# Altium footprint library chipfc_libs.PCBLIB: 337 footprints (part 5 of 22)
Each footprint in its own frame and in the unit in brackets; x right, y up, seen from the top. Pads: shape width x height; smd on the part's side, far side on the other; paste and mask are expansions set on the pad; w line width, h text height; cw(c..) or ccw(c..) is an arc to the next point about the centre after c.
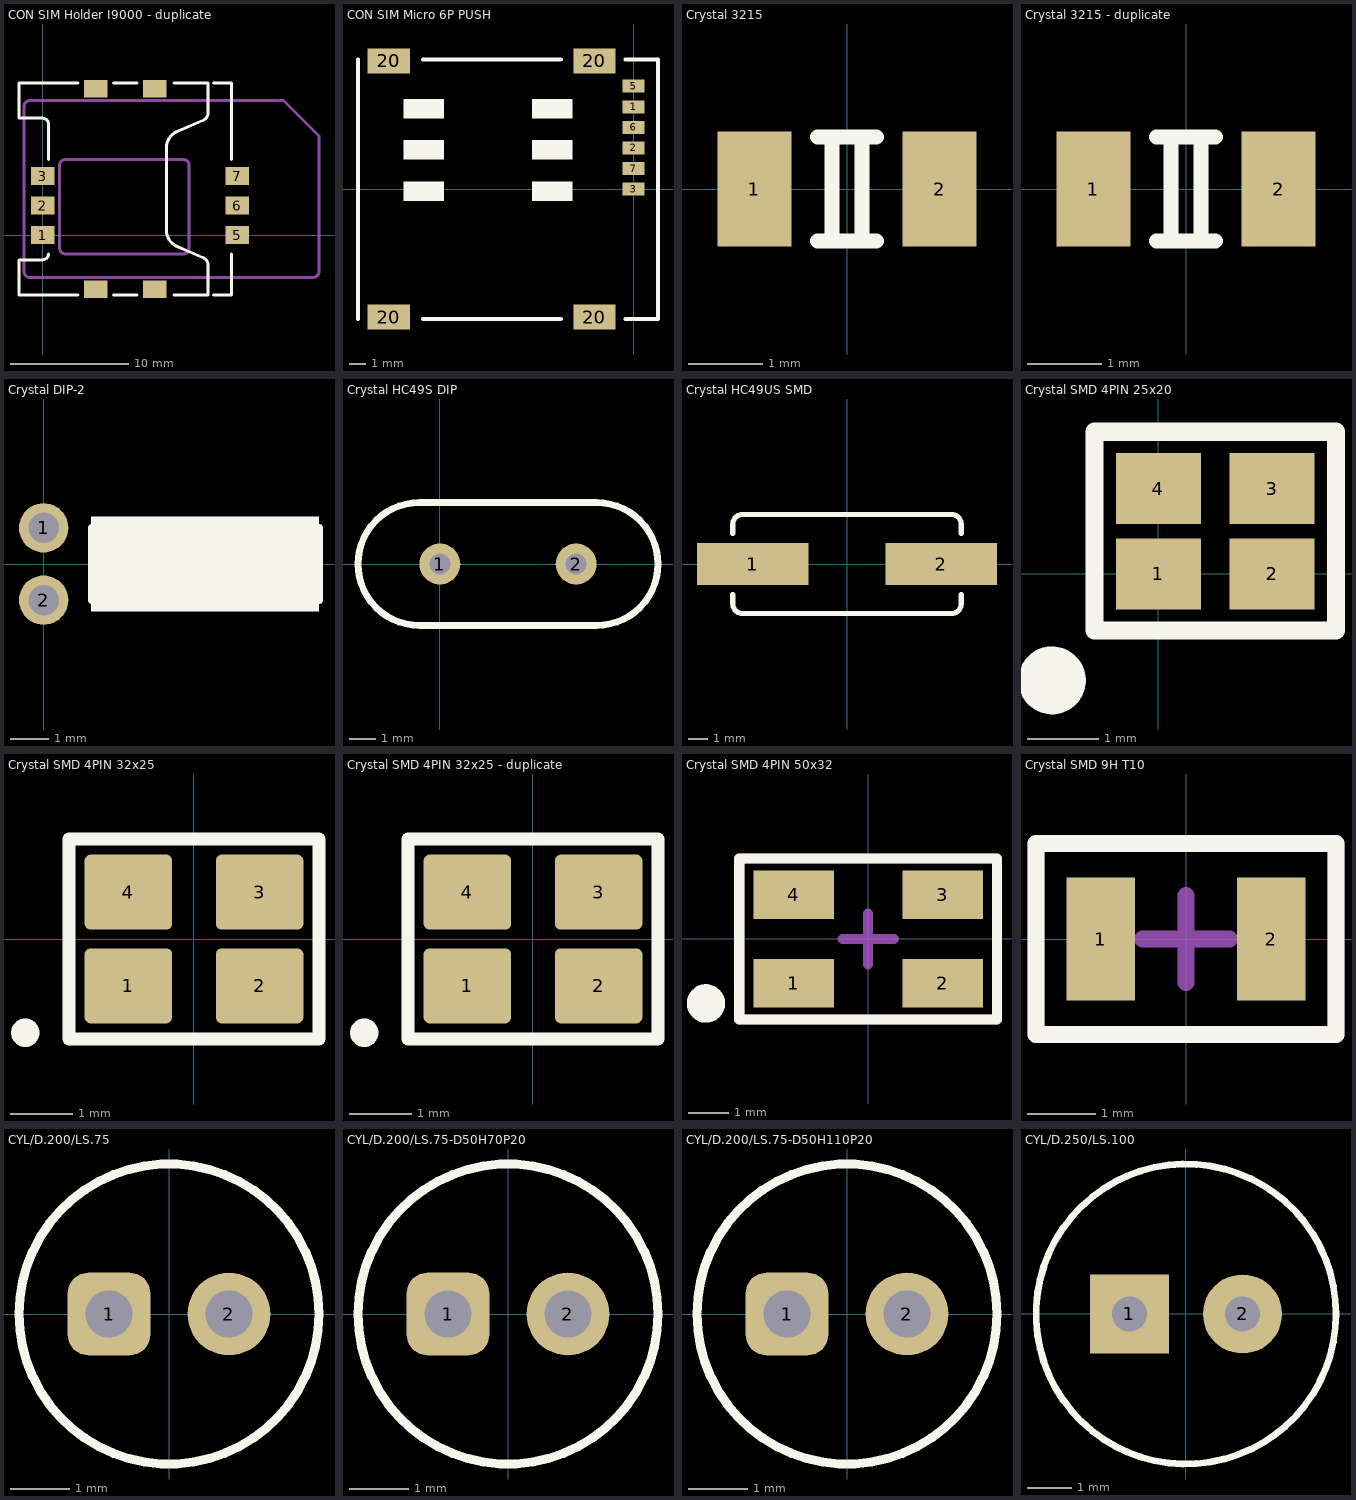
[diagram p4: the footprints below, top view; thin cyan lines are the x and y axes]

## CON SIM Holder I9000 - duplicate [mm] "Molex's SIM Holder,  6 pins"
pads (10):
  rect 2x1.5 smd: 1(0,0) 2(0,2.5) 3(0,5) 5(16.5,0) 6(16.5,2.5) 7(16.5,5) ""(4.5,-4.6) ""(4.5,12.4) ""(9.5,-4.6) ""(9.5,12.4)
Top Overlay:
  lines w0.254: 0.5,-1.6 cw(c0,-1.6) 0,-2.1 -2,-2.1 -2,-5.1 3,-5.1 ; 3,12.9 -2,12.9 -2,9.9 0,9.9 cw(c0,9.4) 0.5,9.4 0.5,6.4 ; 6,-5.1 8,-5.1 ; 6,12.9 8,12.9 ; 11.12,-5.1 14,-5.1 14,-2.5 ; 11.12,12.9 14,12.9 14,10.3 ; 14.008,-2.5 ccw(c13.4,-2.5) 13.6,-1.926 11.504,-1.016 cw(c12,0.4) 10.5,0.4 10.5,7.4 cw(c12,7.4) 11.504,8.816 13.6,9.726 ccw(c13.4,10.3) 14.008,10.3 ; 14.5,-5.1 16,-5.1 16,-1.6 ; 14.5,12.9 16,12.9 16,6.4 ; 0.5,6.4 0.5,6.4
Mechanical 1:
  lines w0.254: -1.57,-3.1 ccw(c-1.07,-3.1) -1.07,-3.6 22.93,-3.6 ccw(c22.93,-3.1) 23.43,-3.1 23.43,8.4 20.43,11.4 -1.07,11.4 ccw(c-1.07,10.9) -1.57,10.9 -1.57,-3.1 ; 1.43,-1.1 ccw(c1.93,-1.1) 1.93,-1.6 11.93,-1.6 ccw(c11.93,-1.1) 12.43,-1.1 12.43,5.9 ccw(c11.93,5.9) 11.93,6.4 1.93,6.4 ccw(c1.93,5.9) 1.43,5.9 1.43,-1.1

## CON SIM Micro 6P PUSH [mm] "SIM Holder,  6 pins"
pads (16):
  rect 1.35x0.8 smd: 1(0,5.08) 2(0,2.54) 3(0,0) 5(0,6.35) 6(0,3.81) 7(0,1.27)
  rect 2.6x1.55 smd: 20(-15.105,-7.89) 20(-15.105,7.91) 20(-2.425,-7.89) 20(-2.425,7.91)
  rect 2.5x1.2 on Top Overlay: ""(-12.955,-0.12) ""(-12.955,2.42) ""(-12.955,4.96) ""(-5.035,-0.12) ""(-5.035,2.42) ""(-5.035,4.96)
Top Overlay:
  lines w0.254: -17,-8 -17,8 ; -13,-8 -4.5,-8 ; -13,8 -4.5,8 ; -0.5,-8 1.5,-8 1.5,8 -0.5,8
3D body "2174803-2.stp": height 1.25, standoff -0.64, extent -16,-7.745 0,7.745

## Crystal 3215 [mm] "Crystal 3.2mm x 1.5mm SMD"
pads (2):
  rect 1x1.55 smd: 1(-1.25,0) 2(1.25,0)
Top Overlay:
  lines w0.203: -0.4,-0.7 0.4,-0.7 ; -0.4,0.7 0.4,0.7 ; -0.2,-0.7 -0.2,0.7 ; 0.2,-0.7 0.2,0.7
3D body "User Library-Siward_SX3215.step": height 0.81, standoff 0, extent -1.6,-0.75 1.6,0.75

## Crystal 3215 - duplicate [mm] "Crystal 3.2mm x 1.5mm SMD"
pads (2):
  rect 1x1.55 smd: 1(-1.25,0) 2(1.25,0)
Top Overlay:
  lines w0.203: -0.4,-0.7 0.4,-0.7 ; -0.4,0.7 0.4,0.7 ; -0.2,-0.7 -0.2,0.7 ; 0.2,-0.7 0.2,0.7
3D body "User Library-Siward_SX3215.step": height 0.81, standoff 0, extent -1.6,-0.75 1.6,0.75

## Crystal DIP-2 [mm] "Available for crystal 32.768kHz"
pads (2):
  round 1.3 hole 0.8: 1(0,0.953) 2(0,-0.953)
Top Overlay:
  rectangle: 1.25,-1.25 7.25,1.25
  lines w0.203: 1.27,-0.953 1.27,0.953 7.25,0.953 7.25,-0.953 1.27,-0.953
3D body "User Library-DT-26-1.step": height 2.1, standoff -1.9, extent -0.1,-1 7.04,1

## Crystal HC49S DIP [mil]
pads (2):
  round 60 / inner round 60 / far side round 70 hole 31: 1(0,0) 2(200,0)
Top Overlay:
  lines w10: -30,-90 cw(c-30,0) -30,90 230,90 cw(c230,0) 230,-90 -30,-90
3D body "User Library-HC49S.STEP": height 142.73, standoff -77.74, extent -119.93,-92.96 319.93,91

## Crystal HC49US SMD [mil]
pads (2):
  rect 220.47x82.67 smd: 1(-187,0) 2(187,0)
Top Overlay:
  lines w10: -226.37,-60 -226.37,-78.73 ccw(c-206.68,-78.73) -206.68,-98.42 206.68,-98.42 ccw(c206.68,-78.73) 226.37,-78.73 226.37,-60 ; -226.37,60 -226.37,78.73 cw(c-206.68,78.73) -206.68,98.42 206.68,98.42 cw(c206.68,78.73) 226.37,78.73 226.37,60
3D body "User Library-HC49US.STEP": height 165.35, standoff 0, extent -250,-93 250,92.04

## Crystal SMD 4PIN 25x20 [mm]
pads (4):
  rect 1.2x1 smd: 1(0,0) 2(1.6,0) 3(1.6,1.2) 4(0,1.2)
Top Overlay:
  circle w0.508: c-1.5,-1.5 r0.224
  lines w0.254: -0.9,-0.8 2.5,-0.8 2.5,2 -0.9,2 -0.9,-0.8
3D body "User Library-CRY_2520.step": height 0.55, standoff 0, extent -0.45,-0.4 2.05,1.6

## Crystal SMD 4PIN 32x25 [mm]
pads (4):
  rrect15% 1.4x1.2 smd: 1(-1.05,-0.75) 2(1.05,-0.75) 3(1.05,0.75) 4(-1.05,0.75)
Top Overlay:
  circle w0.254: c-2.7,-1.5 r0.1
  lines w0.203: -2,-1.6 2,-1.6 2,1.6 -2,1.6 -2,-1.6
3D body "User Library-User Library-Siward_SX3225.step": height 0.81, standoff 0, extent -1.6,-1.25 1.6,1.25

## Crystal SMD 4PIN 32x25 - duplicate [mm]
pads (4):
  rrect15% 1.4x1.2 smd: 1(-1.05,-0.75) 2(1.05,-0.75) 3(1.05,0.75) 4(-1.05,0.75)
Top Overlay:
  circle w0.254: c-2.7,-1.5 r0.1
  lines w0.203: -2,-1.6 2,-1.6 2,1.6 -2,1.6 -2,-1.6
3D body "User Library-User Library-Siward_SX3225.step": height 0.81, standoff 0, extent -1.6,-1.25 1.6,1.25

## Crystal SMD 4PIN 50x32 [mm]
pads (4):
  rect 2x1.2 smd: 1(-1.85,-1.1) 2(1.85,-1.1) 3(1.85,1.1) 4(-1.85,1.1)
Top Overlay:
  circle w0.508: c-4.024,-1.6 r0.224
  lines w0.254: -3.2,-2 -3.2,2 3.2,2 3.2,-2 -3.2,-2
Mechanical 15:
  lines w0.254: -0.635,0 0.635,0 ; 0,-0.635 0,0.635 ; -3.2,-2 -3.2,2 3.2,2 3.2,-2 -3.2,-2
3D body "User Library-Crystal.step": height 0.9, standoff -0.05, extent -2.5,-1.6 2.5,1.6

## Crystal SMD 9H T10 [mm] "TXC's SMD kHz crystal 9H T10 Series"
height 0.75
pads (2):
  rect 1x1.8 smd: 1(-1.25,0) 2(1.25,0)
Top Overlay:
  lines w0.254: -2.2,-1.4 2.2,-1.4 2.2,1.4 -2.2,1.4 -2.2,-1.4
Mechanical 15:
  lines w0.254: -0.635,0 0.635,0 ; 0,-0.635 0,0.635 ; -2.2,-1.4 2.2,-1.4 2.2,1.4 -2.2,1.4 -2.2,-1.4

## CYL/D.200/LS.75 [mm]
pads (2):
  rrect50% 1.4x1.4 hole 0.8: 1(-1.016,0)
  round 1.4 hole 0.8: 2(1.016,0)
Top Overlay:
  circle w0.152: c0,0 r2.54
3D body "CircuitWorks-ELECTROLITIC CAPACITOR RADIAL 5X11.step": height 11, standoff -2.5, extent -2.5,-2.5 2.5,2.5

## CYL/D.200/LS.75-D50H70P20 [mm]
pads (2):
  rrect50% 1.4x1.4 hole 0.8: 1(-1.016,0)
  round 1.4 hole 0.8: 2(1.016,0)
Top Overlay:
  circle w0.152: c0,0 r2.54
3D body "CapAluRadial_D50H70P20.step": height 7, standoff -3, extent -2.5,-2.5 2.501,2.5

## CYL/D.200/LS.75-D50H110P20 [mm]
pads (2):
  rrect50% 1.4x1.4 hole 0.8: 1(-1.016,0)
  round 1.4 hole 0.8: 2(1.016,0)
Top Overlay:
  circle w0.152: c0,0 r2.54
3D body "CapAluRadial_D50H110P20.step": height 11, standoff -3, extent -2.5,-2.5 2.501,2.5

## CYL/D.250/LS.100 [mil]
pads (2):
  rect 70x70 hole 31: 1(-50,0)
  round 70 hole 31: 2(50,0)
Top Overlay:
  circle w6: c0,0 r132.72
3D body "User Library-CapAluRadial_D63H110.STEP": height 492.13, standoff -118.11, extent -133.86,-133.45 132.72,133.45